# Altium schematic symbol library jlcpcb_2025_04_capacitors_extended_0402.schlib: 3594 symbols (part 20 of 20)
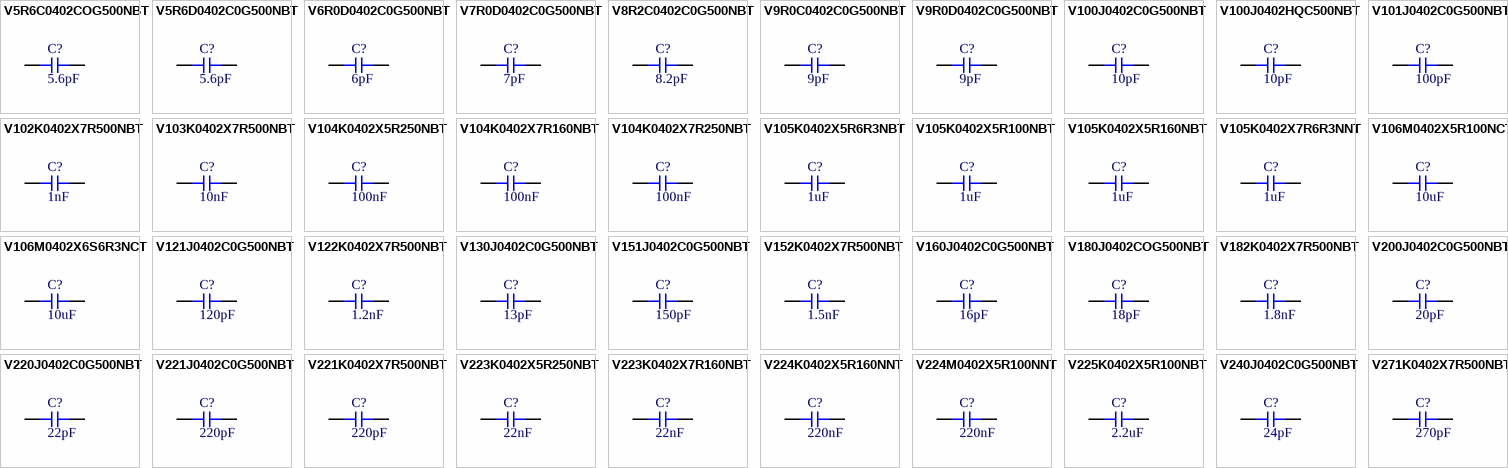
[diagram p108: symbols V5R6C0402COG500NBT to V271K0402X7R500NBT]

## V9R0D0402C0G500NBT
designator C?  Capacitance: 9pF  (hidden comment: *)
Capacitor, Ceramic (MLCC), 9pF, 50V, C0G, SMD 0402; Manufacturer: VIIYONG; Manufacturer Part Number: V9R0D0402C0G500NBT; Package Size: 0402; JLCPCB Basic Part: No; JLCPCB Part Number: C610110; Supplier 1: LCSC; Category: Capacitors - MLCC; Supplier Part Number 1: C610110; Voltage Rating: 50V; Temperature Coefficient: C0G; RoHS: Yes; ComponentLink1Description: Datasheet; ComponentLink1URL: https://wmsc.lcsc.com/wmsc/upload/file/pdf/v2/lcsc/2304140030_VIIYONG-V9R0D0402C0G500NBT_C610110.pdf; ComponentLink2Description: JLCPCB Part URL; ComponentLink2URL: https://jlcpcb.com/partdetail/C610110; ComponentLink3Description: LCSC Part URL; ComponentLink3URL: https://lcsc.com/product-detail/Multilayer-Ceramic-Capacitors-MLCC---SMD-SMT_VIIYONG-VIIYONG-V9R0D0402C0G500NBT_C610110.html
footprint CAP-0402 (0402 (1005M) Capacitor)
pins: 1, 2

## V100J0402C0G500NBT
designator C?  Capacitance: 10pF  (hidden comment: *)
Capacitor, Ceramic (MLCC), 10pF, ±5%, 50V, C0G, ±5%, SMD 0402; Manufacturer: VIIYONG; Manufacturer Part Number: V100J0402C0G500NBT; Package Size: 0402; JLCPCB Basic Part: No; JLCPCB Part Number: C513437; Supplier 1: LCSC; Category: Capacitors - MLCC; Supplier Part Number 1: C513437; Tolerance: ±5%; Voltage Rating: 50V; Temperature Coefficient: C0G; RoHS: Yes; ComponentLink1Description: Datasheet; ComponentLink1URL: https://wmsc.lcsc.com/wmsc/upload/file/pdf/v2/lcsc/2304140030_VIIYONG-V100J0402C0G500NBT_C513437.pdf; ComponentLink2Description: JLCPCB Part URL; ComponentLink2URL: https://jlcpcb.com/partdetail/C513437; ComponentLink3Description: LCSC Part URL; ComponentLink3URL: https://lcsc.com/product-detail/Multilayer-Ceramic-Capacitors-MLCC---SMD-SMT_VIIYONG-VIIYONG-V100J0402C0G500NBT_C513437.html
footprint CAP-0402 (0402 (1005M) Capacitor)
pins: 1, 2

## V100J0402HQC500NBT
designator C?  Capacitance: 10pF  (hidden comment: *)
Capacitor, Ceramic (MLCC), 10pF, 50V, SMD 0402; Manufacturer: VIIYONG; Manufacturer Part Number: V100J0402HQC500NBT; Package Size: 0402; JLCPCB Basic Part: No; JLCPCB Part Number: C2841457; Supplier 1: LCSC; Category: Capacitors - MLCC; Supplier Part Number 1: C2841457; Voltage Rating: 50V; RoHS: Yes; ComponentLink1Description: Datasheet; ComponentLink1URL: https://wmsc.lcsc.com/wmsc/upload/file/pdf/v2/lcsc/2202132030_VIIYONG-V100J0402HQC500NBT_C2841457.pdf; ComponentLink2Description: JLCPCB Part URL; ComponentLink2URL: https://jlcpcb.com/partdetail/C2841457; ComponentLink3Description: LCSC Part URL; ComponentLink3URL: https://lcsc.com/product-detail/Multilayer-Ceramic-Capacitors-MLCC---SMD-SMT_VIIYONG-VIIYONG-V100J0402HQC500NBT_C2841457.html
footprint CAP-0402 (0402 (1005M) Capacitor)
pins: 1, 2

## V101J0402C0G500NBT
designator C?  Capacitance: 100pF  (hidden comment: *)
Capacitor, Ceramic (MLCC), 100pF, ±5%, 50V, C0G, ±5%, SMD 0402; Manufacturer: VIIYONG; Manufacturer Part Number: V101J0402C0G500NBT; Package Size: 0402; JLCPCB Basic Part: No; JLCPCB Part Number: C513435; Supplier 1: LCSC; Category: Capacitors - MLCC; Supplier Part Number 1: C513435; Tolerance: ±5%; Voltage Rating: 50V; Temperature Coefficient: C0G; RoHS: Yes; ComponentLink1Description: Datasheet; ComponentLink1URL: https://wmsc.lcsc.com/wmsc/upload/file/pdf/v2/lcsc/2304140030_VIIYONG-V101J0402C0G500NBT_C513435.pdf; ComponentLink2Description: JLCPCB Part URL; ComponentLink2URL: https://jlcpcb.com/partdetail/C513435; ComponentLink3Description: LCSC Part URL; ComponentLink3URL: https://lcsc.com/product-detail/Multilayer-Ceramic-Capacitors-MLCC---SMD-SMT_VIIYONG-VIIYONG-V101J0402C0G500NBT_C513435.html
footprint CAP-0402 (0402 (1005M) Capacitor)
pins: 1, 2

## V102K0402X7R500NBT
designator C?  Capacitance: 1nF  (hidden comment: *)
Capacitor, Ceramic (MLCC), 1nF, ±10%, 50V, X7R, ±10%, SMD 0402; Manufacturer: VIIYONG; Manufacturer Part Number: V102K0402X7R500NBT; Package Size: 0402; JLCPCB Basic Part: No; JLCPCB Part Number: C609895; Supplier 1: LCSC; Category: Capacitors - MLCC; Supplier Part Number 1: C609895; Tolerance: ±10%; Voltage Rating: 50V; Temperature Coefficient: X7R; RoHS: Yes; ComponentLink1Description: Datasheet; ComponentLink1URL: https://wmsc.lcsc.com/wmsc/upload/file/pdf/v2/lcsc/2304140030_VIIYONG-V102K0402X7R500NBT_C609895.pdf; ComponentLink2Description: JLCPCB Part URL; ComponentLink2URL: https://jlcpcb.com/partdetail/C609895; ComponentLink3Description: LCSC Part URL; ComponentLink3URL: https://lcsc.com/product-detail/Multilayer-Ceramic-Capacitors-MLCC---SMD-SMT_VIIYONG-VIIYONG-V102K0402X7R500NBT_C609895.html
footprint CAP-0402 (0402 (1005M) Capacitor)
pins: 1, 2

## V103K0402X7R500NBT
designator C?  Capacitance: 10nF  (hidden comment: *)
Capacitor, Ceramic (MLCC), 10nF, ±10%, 50V, X7R, ±10%, SMD 0402; Manufacturer: VIIYONG; Manufacturer Part Number: V103K0402X7R500NBT; Package Size: 0402; JLCPCB Basic Part: No; JLCPCB Part Number: C513436; Supplier 1: LCSC; Category: Capacitors - MLCC; Supplier Part Number 1: C513436; Tolerance: ±10%; Voltage Rating: 50V; Temperature Coefficient: X7R; RoHS: Yes; ComponentLink1Description: Datasheet; ComponentLink1URL: https://wmsc.lcsc.com/wmsc/upload/file/pdf/v2/lcsc/2304140030_VIIYONG-V103K0402X7R500NBT_C513436.pdf; ComponentLink2Description: JLCPCB Part URL; ComponentLink2URL: https://jlcpcb.com/partdetail/C513436; ComponentLink3Description: LCSC Part URL; ComponentLink3URL: https://lcsc.com/product-detail/Multilayer-Ceramic-Capacitors-MLCC---SMD-SMT_VIIYONG-VIIYONG-V103K0402X7R500NBT_C513436.html
footprint CAP-0402 (0402 (1005M) Capacitor)
pins: 1, 2

## V104K0402X5R250NBT
designator C?  Capacitance: 100nF  (hidden comment: *)
Capacitor, Ceramic (MLCC), 100nF, ±10%, 25V, X5R, ±10%, SMD 0402; Manufacturer: VIIYONG; Manufacturer Part Number: V104K0402X5R250NBT; Package Size: 0402; JLCPCB Basic Part: No; JLCPCB Part Number: C609894; Supplier 1: LCSC; Category: Capacitors - MLCC; Supplier Part Number 1: C609894; Tolerance: ±10%; Voltage Rating: 25V; Temperature Coefficient: X5R; RoHS: Yes; ComponentLink1Description: Datasheet; ComponentLink1URL: https://wmsc.lcsc.com/wmsc/upload/file/pdf/v2/lcsc/2304140030_VIIYONG-V104K0402X5R250NBT_C609894.pdf; ComponentLink2Description: JLCPCB Part URL; ComponentLink2URL: https://jlcpcb.com/partdetail/C609894; ComponentLink3Description: LCSC Part URL; ComponentLink3URL: https://lcsc.com/product-detail/Multilayer-Ceramic-Capacitors-MLCC---SMD-SMT_VIIYONG-VIIYONG-V104K0402X5R250NBT_C609894.html
footprint CAP-0402 (0402 (1005M) Capacitor)
pins: 1, 2

## V104K0402X7R160NBT
designator C?  Capacitance: 100nF  (hidden comment: *)
Capacitor, Ceramic (MLCC), 100nF, ±10%, 16V, X7R, ±10%, SMD 0402; Manufacturer: VIIYONG; Manufacturer Part Number: V104K0402X7R160NBT; Package Size: 0402; JLCPCB Basic Part: No; JLCPCB Part Number: C610207; Supplier 1: LCSC; Category: Capacitors - MLCC; Supplier Part Number 1: C610207; Tolerance: ±10%; Voltage Rating: 16V; Temperature Coefficient: X7R; RoHS: Yes; ComponentLink1Description: Datasheet; ComponentLink1URL: https://wmsc.lcsc.com/wmsc/upload/file/pdf/v2/lcsc/2304140030_VIIYONG-V104K0402X7R160NBT_C610207.pdf; ComponentLink2Description: JLCPCB Part URL; ComponentLink2URL: https://jlcpcb.com/partdetail/C610207; ComponentLink3Description: LCSC Part URL; ComponentLink3URL: https://lcsc.com/product-detail/Multilayer-Ceramic-Capacitors-MLCC---SMD-SMT_VIIYONG-VIIYONG-V104K0402X7R160NBT_C610207.html
footprint CAP-0402 (0402 (1005M) Capacitor)
pins: 1, 2

## V104K0402X7R250NBT
designator C?  Capacitance: 100nF  (hidden comment: *)
Capacitor, Ceramic (MLCC), 100nF, ±10%, 25V, ±10%, SMD 0402; Manufacturer: VIIYONG; Manufacturer Part Number: V104K0402X7R250NBT; Package Size: 0402; JLCPCB Basic Part: No; JLCPCB Part Number: C2691403; Supplier 1: LCSC; Category: Capacitors - MLCC; Supplier Part Number 1: C2691403; Tolerance: ±10%; Voltage Rating: 25V; RoHS: Yes; ComponentLink1Description: Datasheet; ComponentLink1URL: https://wmsc.lcsc.com/wmsc/upload/file/pdf/v2/lcsc/2304140030_VIIYONG-V104K0402X7R250NBT_C2691403.pdf; ComponentLink2Description: JLCPCB Part URL; ComponentLink2URL: https://jlcpcb.com/partdetail/C2691403; ComponentLink3Description: LCSC Part URL; ComponentLink3URL: https://lcsc.com/product-detail/Multilayer-Ceramic-Capacitors-MLCC---SMD-SMT_VIIYONG-VIIYONG-V104K0402X7R250NBT_C2691403.html
footprint CAP-0402 (0402 (1005M) Capacitor)
pins: 1, 2

## V105K0402X5R6R3NBT
designator C?  Capacitance: 1uF  (hidden comment: *)
Capacitor, Ceramic (MLCC), 1uF, ±10%, 6.3V, X5R, ±10%, SMD 0402; Manufacturer: VIIYONG; Manufacturer Part Number: V105K0402X5R6R3NBT; Package Size: 0402; JLCPCB Basic Part: No; JLCPCB Part Number: C3036053; Supplier 1: LCSC; Category: Capacitors - MLCC; Supplier Part Number 1: C3036053; Tolerance: ±10%; Voltage Rating: 6.3V; Temperature Coefficient: X5R; RoHS: Yes; ComponentLink1Description: Datasheet; ComponentLink1URL: https://wmsc.lcsc.com/wmsc/upload/file/pdf/v2/lcsc/2206201701_VIIYONG-V105K0402X5R6R3NBT_C3036053.pdf; ComponentLink2Description: JLCPCB Part URL; ComponentLink2URL: https://jlcpcb.com/partdetail/C3036053; ComponentLink3Description: LCSC Part URL; ComponentLink3URL: https://lcsc.com/product-detail/Multilayer-Ceramic-Capacitors-MLCC---SMD-SMT_VIIYONG-VIIYONG-V105K0402X5R6R3NBT_C3036053.html
footprint CAP-0402 (0402 (1005M) Capacitor)
pins: 1, 2

## V105K0402X5R100NBT
designator C?  Capacitance: 1uF  (hidden comment: *)
Capacitor, Ceramic (MLCC), 1uF, 10V, X5R, SMD 0402; Manufacturer: VIIYONG; Manufacturer Part Number: V105K0402X5R100NBT; Package Size: 0402; JLCPCB Basic Part: No; JLCPCB Part Number: C2980386; Supplier 1: LCSC; Category: Capacitors - MLCC; Supplier Part Number 1: C2980386; Voltage Rating: 10V; Temperature Coefficient: X5R; RoHS: Yes; ComponentLink1Description: Datasheet; ComponentLink1URL: https://wmsc.lcsc.com/wmsc/upload/file/pdf/v2/lcsc/2203041530_VIIYONG-V105K0402X5R100NBT_C2980386.pdf; ComponentLink2Description: JLCPCB Part URL; ComponentLink2URL: https://jlcpcb.com/partdetail/C2980386; ComponentLink3Description: LCSC Part URL; ComponentLink3URL: https://lcsc.com/product-detail/Multilayer-Ceramic-Capacitors-MLCC---SMD-SMT_VIIYONG-VIIYONG-V105K0402X5R100NBT_C2980386.html
footprint CAP-0402 (0402 (1005M) Capacitor)
pins: 1, 2

## V105K0402X5R160NBT
designator C?  Capacitance: 1uF  (hidden comment: *)
Capacitor, Ceramic (MLCC), 1uF, 16V, X5R, SMD 0402; Manufacturer: VIIYONG; Manufacturer Part Number: V105K0402X5R160NBT; Package Size: 0402; JLCPCB Basic Part: No; JLCPCB Part Number: C3009903; Supplier 1: LCSC; Category: Capacitors - MLCC; Supplier Part Number 1: C3009903; Voltage Rating: 16V; Temperature Coefficient: X5R; RoHS: Yes; ComponentLink1Description: Datasheet; ComponentLink1URL: https://wmsc.lcsc.com/wmsc/upload/file/pdf/v2/lcsc/2205171716_VIIYONG-V105K0402X5R160NBT_C3009903.pdf; ComponentLink2Description: JLCPCB Part URL; ComponentLink2URL: https://jlcpcb.com/partdetail/C3009903; ComponentLink3Description: LCSC Part URL; ComponentLink3URL: https://lcsc.com/product-detail/Multilayer-Ceramic-Capacitors-MLCC---SMD-SMT_VIIYONG-VIIYONG-V105K0402X5R160NBT_C3009903.html
footprint CAP-0402 (0402 (1005M) Capacitor)
pins: 1, 2

## V105K0402X7R6R3NNT
designator C?  Capacitance: 1uF  (hidden comment: *)
Capacitor, Ceramic (MLCC), 1uF, 6.3V, X7R, SMD 0402; Manufacturer: VIIYONG; Manufacturer Part Number: V105K0402X7R6R3NNT; Package Size: 0402; JLCPCB Basic Part: No; JLCPCB Part Number: C5240378; Supplier 1: LCSC; Category: Capacitors - MLCC; Supplier Part Number 1: C5240378; Voltage Rating: 6.3V; Temperature Coefficient: X7R; RoHS: Yes; ComponentLink1Description: Datasheet; ComponentLink1URL: https://wmsc.lcsc.com/wmsc/upload/file/pdf/v2/lcsc/2210281800_VIIYONG-V105K0402X7R6R3NNT_C5240378.pdf; ComponentLink2Description: JLCPCB Part URL; ComponentLink2URL: https://jlcpcb.com/partdetail/C5240378; ComponentLink3Description: LCSC Part URL; ComponentLink3URL: https://lcsc.com/product-detail/Multilayer-Ceramic-Capacitors-MLCC---SMD-SMT_VIIYONG-VIIYONG-V105K0402X7R6R3NNT_C5240378.html
footprint CAP-0402 (0402 (1005M) Capacitor)
pins: 1, 2

## V106M0402X5R100NCT
designator C?  Capacitance: 10uF  (hidden comment: *)
Capacitor, Ceramic (MLCC), 10uF, 10V, X5R, SMD 0402; Manufacturer: VIIYONG; Manufacturer Part Number: V106M0402X5R100NCT; Package Size: 0402; JLCPCB Basic Part: No; JLCPCB Part Number: C5252392; Supplier 1: LCSC; Category: Capacitors - MLCC; Supplier Part Number 1: C5252392; Voltage Rating: 10V; Temperature Coefficient: X5R; RoHS: Yes; ComponentLink1Description: Datasheet; ComponentLink1URL: https://wmsc.lcsc.com/wmsc/upload/file/pdf/v2/lcsc/2211101800_VIIYONG-V106M0402X5R100NCT_C5252392.pdf; ComponentLink2Description: JLCPCB Part URL; ComponentLink2URL: https://jlcpcb.com/partdetail/C5252392; ComponentLink3Description: LCSC Part URL; ComponentLink3URL: https://lcsc.com/product-detail/Multilayer-Ceramic-Capacitors-MLCC---SMD-SMT_VIIYONG-VIIYONG-V106M0402X5R100NCT_C5252392.html
footprint CAP-0402 (0402 (1005M) Capacitor)
pins: 1, 2

## V106M0402X6S6R3NCT
designator C?  Capacitance: 10uF  (hidden comment: *)
Capacitor, Ceramic (MLCC), 10uF, ±20%, 6.3V, X6S, ±20%, SMD 0402; Manufacturer: VIIYONG; Manufacturer Part Number: V106M0402X6S6R3NCT; Package Size: 0402; JLCPCB Basic Part: No; JLCPCB Part Number: C3009906; Supplier 1: LCSC; Category: Capacitors - MLCC; Supplier Part Number 1: C3009906; Tolerance: ±20%; Voltage Rating: 6.3V; Temperature Coefficient: X6S; RoHS: Yes; ComponentLink1Description: Datasheet; ComponentLink1URL: https://wmsc.lcsc.com/wmsc/upload/file/pdf/v2/lcsc/2205171716_VIIYONG-V106M0402X6S6R3NCT_C3009906.pdf; ComponentLink2Description: JLCPCB Part URL; ComponentLink2URL: https://jlcpcb.com/partdetail/C3009906; ComponentLink3Description: LCSC Part URL; ComponentLink3URL: https://lcsc.com/product-detail/Multilayer-Ceramic-Capacitors-MLCC---SMD-SMT_VIIYONG-VIIYONG-V106M0402X6S6R3NCT_C3009906.html
footprint CAP-0402 (0402 (1005M) Capacitor)
pins: 1, 2

## V121J0402C0G500NBT
designator C?  Capacitance: 120pF  (hidden comment: *)
Capacitor, Ceramic (MLCC), 120pF, ±5%, 50V, C0G, ±5%, SMD 0402; Manufacturer: VIIYONG; Manufacturer Part Number: V121J0402C0G500NBT; Package Size: 0402; JLCPCB Basic Part: No; JLCPCB Part Number: C610144; Supplier 1: LCSC; Category: Capacitors - MLCC; Supplier Part Number 1: C610144; Tolerance: ±5%; Voltage Rating: 50V; Temperature Coefficient: C0G; RoHS: Yes; ComponentLink1Description: Datasheet; ComponentLink1URL: https://wmsc.lcsc.com/wmsc/upload/file/pdf/v2/lcsc/2304140030_VIIYONG-V121J0402C0G500NBT_C610144.pdf; ComponentLink2Description: JLCPCB Part URL; ComponentLink2URL: https://jlcpcb.com/partdetail/C610144; ComponentLink3Description: LCSC Part URL; ComponentLink3URL: https://lcsc.com/product-detail/Multilayer-Ceramic-Capacitors-MLCC---SMD-SMT_VIIYONG-VIIYONG-V121J0402C0G500NBT_C610144.html
footprint CAP-0402 (0402 (1005M) Capacitor)
pins: 1, 2

## V122K0402X7R500NBT
designator C?  Capacitance: 1.2nF  (hidden comment: *)
Capacitor, Ceramic (MLCC), 1.2nF, ±10%, 50V, X7R, ±10%, SMD 0402; Manufacturer: VIIYONG; Manufacturer Part Number: V122K0402X7R500NBT; Package Size: 0402; JLCPCB Basic Part: No; JLCPCB Part Number: C610171; Supplier 1: LCSC; Category: Capacitors - MLCC; Supplier Part Number 1: C610171; Tolerance: ±10%; Voltage Rating: 50V; Temperature Coefficient: X7R; RoHS: Yes; ComponentLink1Description: Datasheet; ComponentLink1URL: https://wmsc.lcsc.com/wmsc/upload/file/pdf/v2/lcsc/2304140030_VIIYONG-V122K0402X7R500NBT_C610171.pdf; ComponentLink2Description: JLCPCB Part URL; ComponentLink2URL: https://jlcpcb.com/partdetail/C610171; ComponentLink3Description: LCSC Part URL; ComponentLink3URL: https://lcsc.com/product-detail/Multilayer-Ceramic-Capacitors-MLCC---SMD-SMT_VIIYONG-VIIYONG-V122K0402X7R500NBT_C610171.html
footprint CAP-0402 (0402 (1005M) Capacitor)
pins: 1, 2

## V130J0402C0G500NBT
designator C?  Capacitance: 13pF  (hidden comment: *)
Capacitor, Ceramic (MLCC), 13pF, ±5%, 50V, C0G, ±5%, SMD 0402; Manufacturer: VIIYONG; Manufacturer Part Number: V130J0402C0G500NBT; Package Size: 0402; JLCPCB Basic Part: No; JLCPCB Part Number: C610113; Supplier 1: LCSC; Category: Capacitors - MLCC; Supplier Part Number 1: C610113; Tolerance: ±5%; Voltage Rating: 50V; Temperature Coefficient: C0G; RoHS: Yes; ComponentLink1Description: Datasheet; ComponentLink1URL: https://wmsc.lcsc.com/wmsc/upload/file/pdf/v2/lcsc/2304140030_VIIYONG-V130J0402C0G500NBT_C610113.pdf; ComponentLink2Description: JLCPCB Part URL; ComponentLink2URL: https://jlcpcb.com/partdetail/C610113; ComponentLink3Description: LCSC Part URL; ComponentLink3URL: https://lcsc.com/product-detail/Multilayer-Ceramic-Capacitors-MLCC---SMD-SMT_VIIYONG-VIIYONG-V130J0402C0G500NBT_C610113.html
footprint CAP-0402 (0402 (1005M) Capacitor)
pins: 1, 2

## V151J0402C0G500NBT
designator C?  Capacitance: 150pF  (hidden comment: *)
Capacitor, Ceramic (MLCC), 150pF, ±5%, 50V, C0G, ±5%, SMD 0402; Manufacturer: VIIYONG; Manufacturer Part Number: V151J0402C0G500NBT; Package Size: 0402; JLCPCB Basic Part: No; JLCPCB Part Number: C610146; Supplier 1: LCSC; Category: Capacitors - MLCC; Supplier Part Number 1: C610146; Tolerance: ±5%; Voltage Rating: 50V; Temperature Coefficient: C0G; RoHS: Yes; ComponentLink1Description: Datasheet; ComponentLink1URL: https://wmsc.lcsc.com/wmsc/upload/file/pdf/v2/lcsc/2304140030_VIIYONG-V151J0402C0G500NBT_C610146.pdf; ComponentLink2Description: JLCPCB Part URL; ComponentLink2URL: https://jlcpcb.com/partdetail/C610146; ComponentLink3Description: LCSC Part URL; ComponentLink3URL: https://lcsc.com/product-detail/Multilayer-Ceramic-Capacitors-MLCC---SMD-SMT_VIIYONG-VIIYONG-V151J0402C0G500NBT_C610146.html
footprint CAP-0402 (0402 (1005M) Capacitor)
pins: 1, 2

## V152K0402X7R500NBT
designator C?  Capacitance: 1.5nF  (hidden comment: *)
Capacitor, Ceramic (MLCC), 1.5nF, ±10%, 50V, X7R, ±10%, SMD 0402; Manufacturer: VIIYONG; Manufacturer Part Number: V152K0402X7R500NBT; Package Size: 0402; JLCPCB Basic Part: No; JLCPCB Part Number: C513432; Supplier 1: LCSC; Category: Capacitors - MLCC; Supplier Part Number 1: C513432; Tolerance: ±10%; Voltage Rating: 50V; Temperature Coefficient: X7R; RoHS: Yes; ComponentLink1Description: Datasheet; ComponentLink1URL: https://wmsc.lcsc.com/wmsc/upload/file/pdf/v2/lcsc/2304140030_VIIYONG-V152K0402X7R500NBT_C513432.pdf; ComponentLink2Description: JLCPCB Part URL; ComponentLink2URL: https://jlcpcb.com/partdetail/C513432; ComponentLink3Description: LCSC Part URL; ComponentLink3URL: https://lcsc.com/product-detail/Multilayer-Ceramic-Capacitors-MLCC---SMD-SMT_VIIYONG-VIIYONG-V152K0402X7R500NBT_C513432.html
footprint CAP-0402 (0402 (1005M) Capacitor)
pins: 1, 2

## V160J0402C0G500NBT
designator C?  Capacitance: 16pF  (hidden comment: *)
Capacitor, Ceramic (MLCC), 16pF, ±5%, 50V, C0G, ±5%, SMD 0402; Manufacturer: VIIYONG; Manufacturer Part Number: V160J0402C0G500NBT; Package Size: 0402; JLCPCB Basic Part: No; JLCPCB Part Number: C610116; Supplier 1: LCSC; Category: Capacitors - MLCC; Supplier Part Number 1: C610116; Tolerance: ±5%; Voltage Rating: 50V; Temperature Coefficient: C0G; RoHS: Yes; ComponentLink1Description: Datasheet; ComponentLink1URL: https://wmsc.lcsc.com/wmsc/upload/file/pdf/v2/lcsc/2304140030_VIIYONG-V160J0402C0G500NBT_C610116.pdf; ComponentLink2Description: JLCPCB Part URL; ComponentLink2URL: https://jlcpcb.com/partdetail/C610116; ComponentLink3Description: LCSC Part URL; ComponentLink3URL: https://lcsc.com/product-detail/Multilayer-Ceramic-Capacitors-MLCC---SMD-SMT_VIIYONG-VIIYONG-V160J0402C0G500NBT_C610116.html
footprint CAP-0402 (0402 (1005M) Capacitor)
pins: 1, 2

## V180J0402COG500NBT
designator C?  Capacitance: 18pF  (hidden comment: *)
Capacitor, Ceramic (MLCC), 18pF, ±5%, 50V, C0G, ±5%, SMD 0402; Manufacturer: VIIYONG; Manufacturer Part Number: V180J0402COG500NBT; Package Size: 0402; JLCPCB Basic Part: No; JLCPCB Part Number: C609883; Supplier 1: LCSC; Category: Capacitors - MLCC; Supplier Part Number 1: C609883; Tolerance: ±5%; Voltage Rating: 50V; Temperature Coefficient: C0G; RoHS: Yes; ComponentLink1Description: Datasheet; ComponentLink1URL: https://wmsc.lcsc.com/wmsc/upload/file/pdf/v2/lcsc/2304140030_VIIYONG-V180J0402COG500NBT_C609883.pdf; ComponentLink2Description: JLCPCB Part URL; ComponentLink2URL: https://jlcpcb.com/partdetail/C609883; ComponentLink3Description: LCSC Part URL; ComponentLink3URL: https://lcsc.com/product-detail/Multilayer-Ceramic-Capacitors-MLCC---SMD-SMT_VIIYONG-VIIYONG-V180J0402COG500NBT_C609883.html
footprint CAP-0402 (0402 (1005M) Capacitor)
pins: 1, 2

## V182K0402X7R500NBT
designator C?  Capacitance: 1.8nF  (hidden comment: *)
Capacitor, Ceramic (MLCC), 1.8nF, ±10%, 50V, X7R, ±10%, SMD 0402; Manufacturer: VIIYONG; Manufacturer Part Number: V182K0402X7R500NBT; Package Size: 0402; JLCPCB Basic Part: No; JLCPCB Part Number: C609903; Supplier 1: LCSC; Category: Capacitors - MLCC; Supplier Part Number 1: C609903; Tolerance: ±10%; Voltage Rating: 50V; Temperature Coefficient: X7R; RoHS: Yes; ComponentLink1Description: Datasheet; ComponentLink1URL: https://wmsc.lcsc.com/wmsc/upload/file/pdf/v2/lcsc/2304140030_VIIYONG-V182K0402X7R500NBT_C609903.pdf; ComponentLink2Description: JLCPCB Part URL; ComponentLink2URL: https://jlcpcb.com/partdetail/C609903; ComponentLink3Description: LCSC Part URL; ComponentLink3URL: https://lcsc.com/product-detail/Multilayer-Ceramic-Capacitors-MLCC---SMD-SMT_VIIYONG-VIIYONG-V182K0402X7R500NBT_C609903.html
footprint CAP-0402 (0402 (1005M) Capacitor)
pins: 1, 2

## V200J0402C0G500NBT
designator C?  Capacitance: 20pF  (hidden comment: *)
Capacitor, Ceramic (MLCC), 20pF, ±5%, 50V, C0G, ±5%, SMD 0402; Manufacturer: VIIYONG; Manufacturer Part Number: V200J0402C0G500NBT; Package Size: 0402; JLCPCB Basic Part: No; JLCPCB Part Number: C513444; Supplier 1: LCSC; Category: Capacitors - MLCC; Supplier Part Number 1: C513444; Tolerance: ±5%; Voltage Rating: 50V; Temperature Coefficient: C0G; RoHS: Yes; ComponentLink1Description: Datasheet; ComponentLink1URL: https://wmsc.lcsc.com/wmsc/upload/file/pdf/v2/lcsc/2304140030_VIIYONG-V200J0402C0G500NBT_C513444.pdf; ComponentLink2Description: JLCPCB Part URL; ComponentLink2URL: https://jlcpcb.com/partdetail/C513444; ComponentLink3Description: LCSC Part URL; ComponentLink3URL: https://lcsc.com/product-detail/Multilayer-Ceramic-Capacitors-MLCC---SMD-SMT_VIIYONG-VIIYONG-V200J0402C0G500NBT_C513444.html
footprint CAP-0402 (0402 (1005M) Capacitor)
pins: 1, 2

## V220J0402C0G500NBT
designator C?  Capacitance: 22pF  (hidden comment: *)
Capacitor, Ceramic (MLCC), 22pF, ±5%, 50V, C0G, ±5%, SMD 0402; Manufacturer: VIIYONG; Manufacturer Part Number: V220J0402C0G500NBT; Package Size: 0402; JLCPCB Basic Part: No; JLCPCB Part Number: C513446; Supplier 1: LCSC; Category: Capacitors - MLCC; Supplier Part Number 1: C513446; Tolerance: ±5%; Voltage Rating: 50V; Temperature Coefficient: C0G; RoHS: Yes; ComponentLink1Description: Datasheet; ComponentLink1URL: https://wmsc.lcsc.com/wmsc/upload/file/pdf/v2/lcsc/2304140030_VIIYONG-V220J0402C0G500NBT_C513446.pdf; ComponentLink2Description: JLCPCB Part URL; ComponentLink2URL: https://jlcpcb.com/partdetail/C513446; ComponentLink3Description: LCSC Part URL; ComponentLink3URL: https://lcsc.com/product-detail/Multilayer-Ceramic-Capacitors-MLCC---SMD-SMT_VIIYONG-VIIYONG-V220J0402C0G500NBT_C513446.html
footprint CAP-0402 (0402 (1005M) Capacitor)
pins: 1, 2

## V221J0402C0G500NBT
designator C?  Capacitance: 220pF  (hidden comment: *)
Capacitor, Ceramic (MLCC), 220pF, ±5%, 50V, C0G, ±5%, SMD 0402; Manufacturer: VIIYONG; Manufacturer Part Number: V221J0402C0G500NBT; Package Size: 0402; JLCPCB Basic Part: No; JLCPCB Part Number: C513777; Supplier 1: LCSC; Category: Capacitors - MLCC; Supplier Part Number 1: C513777; Tolerance: ±5%; Voltage Rating: 50V; Temperature Coefficient: C0G; RoHS: Yes; ComponentLink1Description: Datasheet; ComponentLink1URL: https://wmsc.lcsc.com/wmsc/upload/file/pdf/v2/lcsc/2304140030_VIIYONG-V221J0402C0G500NBT_C513777.pdf; ComponentLink2Description: JLCPCB Part URL; ComponentLink2URL: https://jlcpcb.com/partdetail/C513777; ComponentLink3Description: LCSC Part URL; ComponentLink3URL: https://lcsc.com/product-detail/Multilayer-Ceramic-Capacitors-MLCC---SMD-SMT_VIIYONG-VIIYONG-V221J0402C0G500NBT_C513777.html
footprint CAP-0402 (0402 (1005M) Capacitor)
pins: 1, 2

## V221K0402X7R500NBT
designator C?  Capacitance: 220pF  (hidden comment: *)
Capacitor, Ceramic (MLCC), 220pF, ±10%, 50V, X7R, ±10%, SMD 0402; Manufacturer: VIIYONG; Manufacturer Part Number: V221K0402X7R500NBT; Package Size: 0402; JLCPCB Basic Part: No; JLCPCB Part Number: C513445; Supplier 1: LCSC; Category: Capacitors - MLCC; Supplier Part Number 1: C513445; Tolerance: ±10%; Voltage Rating: 50V; Temperature Coefficient: X7R; RoHS: Yes; ComponentLink1Description: Datasheet; ComponentLink1URL: https://wmsc.lcsc.com/wmsc/upload/file/pdf/v2/lcsc/2304140030_VIIYONG-V221K0402X7R500NBT_C513445.pdf; ComponentLink2Description: JLCPCB Part URL; ComponentLink2URL: https://jlcpcb.com/partdetail/C513445; ComponentLink3Description: LCSC Part URL; ComponentLink3URL: https://lcsc.com/product-detail/Multilayer-Ceramic-Capacitors-MLCC---SMD-SMT_VIIYONG-VIIYONG-V221K0402X7R500NBT_C513445.html
footprint CAP-0402 (0402 (1005M) Capacitor)
pins: 1, 2

## V223K0402X5R250NBT
designator C?  Capacitance: 22nF  (hidden comment: *)
Capacitor, Ceramic (MLCC), 22nF, ±10%, 25V, X5R, ±10%, SMD 0402; Manufacturer: VIIYONG; Manufacturer Part Number: V223K0402X5R250NBT; Package Size: 0402; JLCPCB Basic Part: No; JLCPCB Part Number: C610193; Supplier 1: LCSC; Category: Capacitors - MLCC; Supplier Part Number 1: C610193; Tolerance: ±10%; Voltage Rating: 25V; Temperature Coefficient: X5R; RoHS: Yes; ComponentLink1Description: Datasheet; ComponentLink1URL: https://wmsc.lcsc.com/wmsc/upload/file/pdf/v2/lcsc/2304140030_VIIYONG-V223K0402X5R250NBT_C610193.pdf; ComponentLink2Description: JLCPCB Part URL; ComponentLink2URL: https://jlcpcb.com/partdetail/C610193; ComponentLink3Description: LCSC Part URL; ComponentLink3URL: https://lcsc.com/product-detail/Multilayer-Ceramic-Capacitors-MLCC---SMD-SMT_VIIYONG-VIIYONG-V223K0402X5R250NBT_C610193.html
footprint CAP-0402 (0402 (1005M) Capacitor)
pins: 1, 2

## V223K0402X7R160NBT
designator C?  Capacitance: 22nF  (hidden comment: *)
Capacitor, Ceramic (MLCC), 22nF, ±10%, 16V, X7R, ±10%, SMD 0402; Manufacturer: VIIYONG; Manufacturer Part Number: V223K0402X7R160NBT; Package Size: 0402; JLCPCB Basic Part: No; JLCPCB Part Number: C2976050; Supplier 1: LCSC; Category: Capacitors - MLCC; Supplier Part Number 1: C2976050; Tolerance: ±10%; Voltage Rating: 16V; Temperature Coefficient: X7R; RoHS: Yes; ComponentLink1Description: Datasheet; ComponentLink1URL: https://wmsc.lcsc.com/wmsc/upload/file/pdf/v2/lcsc/2202211830_VIIYONG-V223K0402X7R160NBT_C2976050.pdf; ComponentLink2Description: JLCPCB Part URL; ComponentLink2URL: https://jlcpcb.com/partdetail/C2976050; ComponentLink3Description: LCSC Part URL; ComponentLink3URL: https://lcsc.com/product-detail/Multilayer-Ceramic-Capacitors-MLCC---SMD-SMT_VIIYONG-VIIYONG-V223K0402X7R160NBT_C2976050.html
footprint CAP-0402 (0402 (1005M) Capacitor)
pins: 1, 2

## V224K0402X5R160NNT
designator C?  Capacitance: 220nF  (hidden comment: *)
Capacitor, Ceramic (MLCC), 220nF, ±10%, 16V, X5R, ±10%, SMD 0402; Manufacturer: VIIYONG; Manufacturer Part Number: V224K0402X5R160NNT; Package Size: 0402; JLCPCB Basic Part: No; JLCPCB Part Number: C2976055; Supplier 1: LCSC; Category: Capacitors - MLCC; Supplier Part Number 1: C2976055; Tolerance: ±10%; Voltage Rating: 16V; Temperature Coefficient: X5R; RoHS: Yes; ComponentLink1Description: Datasheet; ComponentLink1URL: https://wmsc.lcsc.com/wmsc/upload/file/pdf/v2/lcsc/2202211830_VIIYONG-V224K0402X5R160NNT_C2976055.pdf; ComponentLink2Description: JLCPCB Part URL; ComponentLink2URL: https://jlcpcb.com/partdetail/C2976055; ComponentLink3Description: LCSC Part URL; ComponentLink3URL: https://lcsc.com/product-detail/Multilayer-Ceramic-Capacitors-MLCC---SMD-SMT_VIIYONG-VIIYONG-V224K0402X5R160NNT_C2976055.html
footprint CAP-0402 (0402 (1005M) Capacitor)
pins: 1, 2

## V224M0402X5R100NNT
designator C?  Capacitance: 220nF  (hidden comment: *)
Capacitor, Ceramic (MLCC), 220nF, ±20%, 10V, ±20%, SMD 0402; Manufacturer: VIIYONG; Manufacturer Part Number: V224M0402X5R100NNT; Package Size: 0402; JLCPCB Basic Part: No; JLCPCB Part Number: C962113; Supplier 1: LCSC; Category: Capacitors - MLCC; Supplier Part Number 1: C962113; Tolerance: ±20%; Voltage Rating: 10V; RoHS: Yes; ComponentLink1Description: Datasheet; ComponentLink1URL: https://wmsc.lcsc.com/wmsc/upload/file/pdf/v2/lcsc/2304140030_VIIYONG-V224M0402X5R100NNT_C962113.pdf; ComponentLink2Description: JLCPCB Part URL; ComponentLink2URL: https://jlcpcb.com/partdetail/C962113; ComponentLink3Description: LCSC Part URL; ComponentLink3URL: https://lcsc.com/product-detail/Multilayer-Ceramic-Capacitors-MLCC---SMD-SMT_VIIYONG-VIIYONG-V224M0402X5R100NNT_C962113.html
footprint CAP-0402 (0402 (1005M) Capacitor)
pins: 1, 2

## V225K0402X5R100NBT
designator C?  Capacitance: 2.2uF  (hidden comment: *)
Capacitor, Ceramic (MLCC), 2.2uF, ±10%, 10V, X5R, ±10%, SMD 0402; Manufacturer: VIIYONG; Manufacturer Part Number: V225K0402X5R100NBT; Package Size: 0402; JLCPCB Basic Part: No; JLCPCB Part Number: C2976056; Supplier 1: LCSC; Category: Capacitors - MLCC; Supplier Part Number 1: C2976056; Tolerance: ±10%; Voltage Rating: 10V; Temperature Coefficient: X5R; RoHS: Yes; ComponentLink1Description: Datasheet; ComponentLink1URL: https://wmsc.lcsc.com/wmsc/upload/file/pdf/v2/lcsc/2202211830_VIIYONG-V225K0402X5R100NBT_C2976056.pdf; ComponentLink2Description: JLCPCB Part URL; ComponentLink2URL: https://jlcpcb.com/partdetail/C2976056; ComponentLink3Description: LCSC Part URL; ComponentLink3URL: https://lcsc.com/product-detail/Multilayer-Ceramic-Capacitors-MLCC---SMD-SMT_VIIYONG-VIIYONG-V225K0402X5R100NBT_C2976056.html
footprint CAP-0402 (0402 (1005M) Capacitor)
pins: 1, 2

## V240J0402C0G500NBT
designator C?  Capacitance: 24pF  (hidden comment: *)
Capacitor, Ceramic (MLCC), 24pF, ±5%, 50V, C0G, ±5%, SMD 0402; Manufacturer: VIIYONG; Manufacturer Part Number: V240J0402C0G500NBT; Package Size: 0402; JLCPCB Basic Part: No; JLCPCB Part Number: C610122; Supplier 1: LCSC; Category: Capacitors - MLCC; Supplier Part Number 1: C610122; Tolerance: ±5%; Voltage Rating: 50V; Temperature Coefficient: C0G; RoHS: Yes; ComponentLink1Description: Datasheet; ComponentLink1URL: https://wmsc.lcsc.com/wmsc/upload/file/pdf/v2/lcsc/2304140030_VIIYONG-V240J0402C0G500NBT_C610122.pdf; ComponentLink2Description: JLCPCB Part URL; ComponentLink2URL: https://jlcpcb.com/partdetail/C610122; ComponentLink3Description: LCSC Part URL; ComponentLink3URL: https://lcsc.com/product-detail/Multilayer-Ceramic-Capacitors-MLCC---SMD-SMT_VIIYONG-VIIYONG-V240J0402C0G500NBT_C610122.html
footprint CAP-0402 (0402 (1005M) Capacitor)
pins: 1, 2

## V271K0402X7R500NBT
designator C?  Capacitance: 270pF  (hidden comment: *)
Capacitor, Ceramic (MLCC), 270pF, ±10%, 50V, X7R, ±10%, SMD 0402; Manufacturer: VIIYONG; Manufacturer Part Number: V271K0402X7R500NBT; Package Size: 0402; JLCPCB Basic Part: No; JLCPCB Part Number: C610161; Supplier 1: LCSC; Category: Capacitors - MLCC; Supplier Part Number 1: C610161; Tolerance: ±10%; Voltage Rating: 50V; Temperature Coefficient: X7R; RoHS: Yes; ComponentLink1Description: Datasheet; ComponentLink1URL: https://wmsc.lcsc.com/wmsc/upload/file/pdf/v2/lcsc/2304140030_VIIYONG-V271K0402X7R500NBT_C610161.pdf; ComponentLink2Description: JLCPCB Part URL; ComponentLink2URL: https://jlcpcb.com/partdetail/C610161; ComponentLink3Description: LCSC Part URL; ComponentLink3URL: https://lcsc.com/product-detail/Multilayer-Ceramic-Capacitors-MLCC---SMD-SMT_VIIYONG-VIIYONG-V271K0402X7R500NBT_C610161.html
footprint CAP-0402 (0402 (1005M) Capacitor)
pins: 1, 2
